# Altium footprint library QFN.PcbLib: 54 footprints (part 2 of 4)
Each footprint in its own frame and in the unit in brackets; x right, y up, seen from the top. Pads: shape width x height; smd on the part's side, far side on the other; paste and mask are expansions set on the pad; w line width, h text height; cw(c..) or ccw(c..) is an arc to the next point about the centre after c.
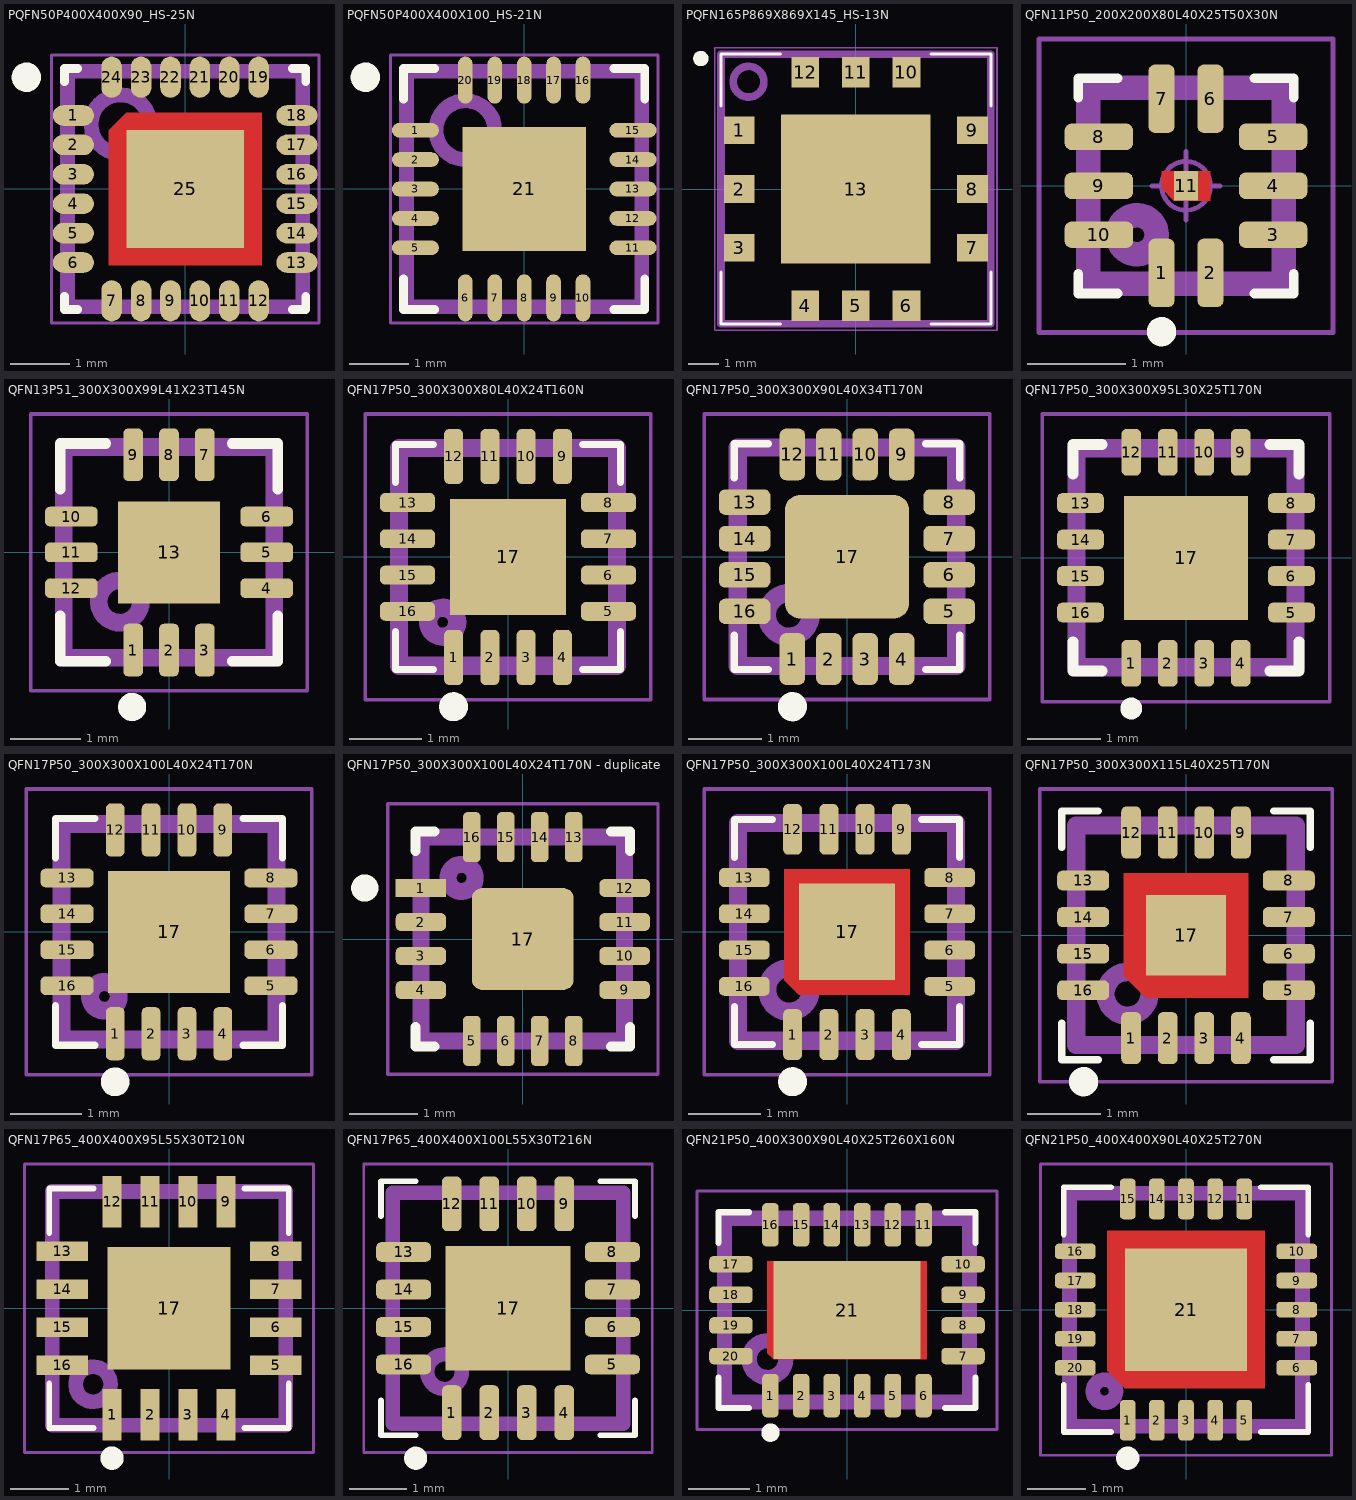
[diagram p1: the footprints below, top view; thin cyan lines are the x and y axes]

## PQFN50P400X400X90_HS-25N [mm] "PQFN, 24-Leads, Body 4,00x4,00mm, Pitch 0,50mm, Thermal Pad 2,60x2,60mm, IPC Medium Density"
height 0.9
pads (25):
  oval 0.7x0.35 smd: 1(-1.9,1.25) 2(-1.9,0.75) 3(-1.9,0.25) 4(-1.9,-0.25) 5(-1.9,-0.75) 6(-1.9,-1.25) 13(1.9,-1.25) 14(1.9,-0.75) 15(1.9,-0.25) 16(1.9,0.25) 17(1.9,0.75) 18(1.9,1.25)
  oval 0.35x0.7 smd: 7(-1.25,-1.9) 8(-0.75,-1.9) 9(-0.25,-1.9) 10(0.25,-1.9) 11(0.75,-1.9) 12(1.25,-1.9) 19(1.25,1.9) 20(0.75,1.9) 21(0.25,1.9) 22(-0.25,1.9) 23(-0.75,1.9) 24(-1.25,1.9)
  rect 2x2 smd: 25(0,0)
Top Layer:
  region: -1,1.3 1.3,1.3 1.3,-1.3 -1.3,-1.3 -1.3,1
Top Overlay:
  circle w0.25: c-2.7,1.9 r0.125
  lines w0.15: -2.05,-1.825 -2.05,-2.05 -1.825,-2.05 ; -2.05,1.825 -2.05,2.05 -1.825,2.05 ; 1.825,-2.05 2.05,-2.05 2.05,-1.825 ; 1.825,2.05 2.05,2.05 2.05,1.825
Top Assembly:
  circle w0.25: c-1.1,1.1 r0.5
  lines w0.25: -2,-2 2,-2 2,2 -2,2 -2,-2
  text ".Designator" at -1.6,-0.7 h1.5
Top Courtyard:
  circle w0.05: c0,0 r0.3
  lines w0.05: -0.5,0 0.5,0 ; 0,-0.5 0,0.5 ; -2.275,-2.275 2.275,-2.275 2.275,2.275 -2.275,2.275 -2.275,-2.275
3D body "PQFN50P400X400X90_HS-25N.step": height 0.9, standoff 0, extent -2,-2 2,2

## PQFN50P400X400X100_HS-21N [mm] "PQFN, 20-Leads, Body 4,00x4,00mm, Pitch 0,50mm, Thermal Pad 2,10x2,10mm, IPC Medium Density"
height 1
pads (21):
  oval 0.8x0.25 smd: 1(-1.85,1) 2(-1.85,0.5) 3(-1.85,0) 4(-1.85,-0.5) 5(-1.85,-1) 11(1.85,-1) 12(1.85,-0.5) 13(1.85,0) 14(1.85,0.5) 15(1.85,1)
  oval 0.25x0.8 smd: 6(-1,-1.85) 7(-0.5,-1.85) 8(0,-1.85) 9(0.5,-1.85) 10(1,-1.85) 16(1,1.85) 17(0.5,1.85) 18(0,1.85) 19(-0.5,1.85) 20(-1,1.85)
  rect 2.1x2.1 smd: 21(0,0)
Top Overlay:
  circle w0.25: c-2.7,1.9 r0.125
  lines w0.15: -2.05,-1.525 -2.05,-2.05 -1.525,-2.05 ; -2.05,1.525 -2.05,2.05 -1.525,2.05 ; 1.525,-2.05 2.05,-2.05 2.05,-1.525 ; 1.525,2.05 2.05,2.05 2.05,1.525
Top Assembly:
  circle w0.25: c-1,1 r0.5
  lines w0.25: -2,-2 -2,2 2,2 2,-2 -2,-2
  text ".Designator" at -1.6,-1 h1.5
Top Courtyard:
  circle w0.05: c0,0 r0.3
  lines w0.05: -0.5,0 0.5,0 ; 0,-0.5 0,0.5 ; -2.275,-2.275 -2.275,2.275 2.275,2.275 2.275,-2.275 -2.275,-2.275
3D body "PQFN50P400X400X100_HS-21N.step": height 1, standoff 0, extent -2,-2 2,2

## PQFN165P869X869X145_HS-13N [mm] "PQFN, 12-Leads, Body 8.69x8.69mm, Pitch 1.65mm/1.91mm, Thermal Pad 4.87x4.87mm, IPC Medium Density"
height 1.45
pads (13):
  rect 1x0.9 smd: 1(-3.8,1.91) 2(-3.8,0) 3(-3.8,-1.91) 7(3.8,-1.91) 8(3.8,0) 9(3.8,1.91)
  rect 0.9x1 smd: 4(-1.65,-3.8) 5(0,-3.8) 6(1.65,-3.8) 10(1.65,3.8) 11(0,3.8) 12(-1.65,3.8)
  rect 4.87x4.87 smd: 13(0,0)
Top Overlay:
  circle w0.25: c-5.05,4.25 r0.125
  lines w0.1: -4.4,-2.71 -4.4,-4.4 -2.45,-4.4 ; -4.4,2.71 -4.4,4.4 -2.45,4.4 ; 2.45,-4.4 4.4,-4.4 4.4,-2.71 ; 2.45,4.4 4.4,4.4 4.4,2.71
Top Assembly:
  circle w0.25: c-3.495,3.495 r0.5
  lines w0.25: -4.395,-4.395 4.395,-4.395 4.395,4.395 -4.395,4.395 -4.395,-4.395
  text ".Designator" at -3.5,-0.3 h1.5
Top Courtyard:
  lines w0.05: -4.6,-4.6 4.6,-4.6 4.6,4.6 -4.6,4.6 -4.6,-4.6
  lines w0.1: -0.5,0 0.5,0 ; 0,-0.5 0,0.5
3D body "PQFN165P869X869X145_HS-13N.step": height 1.45, standoff 0, extent -4.395,-4.395 4.395,4.395

## QFN11P50_200X200X80L40X25T50X30N [mm] "Quad Flat No-Lead (QFN with Tab), 0.50 mm pitch; square, 2 pin X 3 pin, 2.00 mm L X 2.00 mm W X 0.80 mm H body"
height 0.8
pads (11):
  rrect52% 0.27x0.7 smd: 1(-0.25,-0.89) 2(0.25,-0.89) 6(0.25,0.89) 7(-0.25,0.89)
  rrect52% 0.7x0.27 smd: 3(0.89,-0.5) 4(0.89,0) 5(0.89,0.5) 8(-0.89,0.5) 9(-0.89,0) 10(-0.89,-0.5)
  rect 0.25x0.3 smd paste-0.3 mask-0.3: 11(0,0)
Top Layer:
  region: 0.25,-0.15 -0.125,-0.15 -0.25,-0.025 -0.25,0.15 0.25,0.15
Top Overlay:
  circle w0.15: c-0.25,-1.49 r0.075
  lines w0.1: -1.1,-0.9 -1.1,-1.1 -0.7,-1.1 ; -1.1,0.9 -1.1,1.1 -0.7,1.1 ; 0.7,-1.1 1.1,-1.1 1.1,-0.9 ; 0.7,1.1 1.1,1.1 1.1,0.9
Top Paste:
  region: 0.25,-0.15 -0.125,-0.15 -0.25,-0.025 -0.25,0.15 0.25,0.15
Top Solder:
  region: 0.25,-0.15 -0.125,-0.15 -0.25,-0.025 -0.25,0.15 0.25,0.15
Top Assembly:
  circle w0.25: c-0.5,-0.5 r0.2
  lines w0.25: -1,-1 -1,1 1,1 1,-1 -1,-1
  text ".Designator" at -1.9,1.5 h1.5
Top Courtyard:
  circle w0.05: c0,0 r0.25
  lines w0.05: -0.35,0 0.35,0 ; 0,-0.35 0,0.35 ; -1.5,-1.5 -1.5,1.5 1.5,1.5 1.5,-1.5 -1.5,-1.5
3D body "QFN11P50_200X200X80L40X25T50X30.STEP": height 0.8, standoff 0, extent -1.05,-1.05 1.05,1.05

## QFN13P51_300X300X99L41X23T145N [mm] "Quad Flat No-Lead (QFN with Tab), 0.51 mm pitch; square, 3 pin X 3 pin, 3.00 mm L X 3.00 mm W X 0.99 mm H body"
height 0.99
pads (13):
  rrect50% 0.28x0.75 smd: 1(-0.51,-1.39) 2(0,-1.39) 3(0.51,-1.39) 7(0.51,1.39) 8(0,1.39) 9(-0.51,1.39)
  rrect50% 0.75x0.28 smd: 4(1.39,-0.51) 5(1.39,0) 6(1.39,0.51) 10(-1.39,0.51) 11(-1.39,0) 12(-1.39,-0.51)
  rect 1.45x1.45 smd paste-1.45: 13(0,0)
Top Overlay:
  circle w0.2: c-0.525,-2.2 r0.1
  lines w0.15: -1.55,-0.9 -1.55,-1.55 -0.9,-1.55 ; -1.55,0.9 -1.55,1.55 -0.9,1.55 ; 0.9,-1.55 1.55,-1.55 1.55,-0.9 ; 0.9,1.55 1.55,1.55 1.55,0.9
Top Paste:
  region: -0.105,0.105 -0.615,0.105 -0.615,0.615 -0.105,0.615
  region: -0.105,-0.615 -0.615,-0.615 -0.615,-0.105 -0.105,-0.105
  region: 0.615,0.105 0.105,0.105 0.105,0.615 0.615,0.615
  region: 0.615,-0.615 0.105,-0.615 0.105,-0.105 0.615,-0.105
Top Assembly:
  circle w0.25: c-0.7,-0.7 r0.3
  lines w0.25: -1.5,-1.5 1.5,-1.5 1.5,1.5 -1.5,1.5 -1.5,-1.5
  text ".Designator" at -1,0 h1.5
Top Courtyard:
  circle w0.05: c0,0 r0.25
  lines w0.05: -0.35,0 0.35,0 ; 0,-0.35 0,0.35 ; -1.97,-1.97 1.97,-1.97 1.97,1.97 -1.97,1.97 -1.97,-1.97
3D body "QFN13P51_300X300X99L41X23T145.STEP": height 0.99, standoff 0, extent -1.55,-1.55 1.55,1.55

## QFN17P50_300X300X80L40X24T160N [mm] "Quad Flat No-Lead (QFN with Tab), 0.50 mm pitch; square, 4 pin X 4 pin, 3.00 mm L X 3.00 mm W X 0.80 mm H body"
height 0.8
pads (17):
  rrect54% 0.26x0.76 smd: 1(-0.75,-1.385) 2(-0.25,-1.385) 3(0.25,-1.385) 4(0.75,-1.385) 9(0.75,1.385) 10(0.25,1.385) 11(-0.25,1.385) 12(-0.75,1.385)
  rrect54% 0.76x0.26 smd: 5(1.385,-0.75) 6(1.385,-0.25) 7(1.385,0.25) 8(1.385,0.75) 13(-1.385,0.75) 14(-1.385,0.25) 15(-1.385,-0.25) 16(-1.385,-0.75)
  rect 1.6x1.6 smd paste-1.6: 17(0,0)
Top Overlay:
  circle w0.2: c-0.75,-2.065 r0.1
  lines w0.1: -1.55,-1.03 -1.55,-1.55 -1.03,-1.55 ; -1.55,1.03 -1.55,1.55 -1.03,1.55 ; 1.03,-1.55 1.55,-1.55 1.55,-1.03 ; 1.03,1.55 1.55,1.55 1.55,1.03
Top Paste:
  region: 0.65,-0.65 0.08,-0.65 0.08,-0.08 0.65,-0.08
  region: 0.65,0.08 0.08,0.08 0.08,0.65 0.65,0.65
  region: -0.08,-0.65 -0.65,-0.65 -0.65,-0.08 -0.08,-0.08
  region: -0.08,0.08 -0.65,0.08 -0.65,0.65 -0.08,0.65
Top Assembly:
  circle w0.25: c-0.9,-0.9 r0.2
  lines w0.25: -1.5,-1.5 -1.5,1.5 1.5,1.5 1.5,-1.5 -1.5,-1.5
  text ".Designator" at -2.5,2 h1.5
Top Courtyard:
  circle w0.05: c0,0 r0.25
  lines w0.05: -0.35,0 0.35,0 ; 0,-0.35 0,0.35 ; -1.97,-1.97 -1.97,1.97 1.97,1.97 1.97,-1.97 -1.97,-1.97
3D body "QFN17P50_300X300X80L40X24T160.STEP": height 0.8, standoff 0, extent -1.55,-1.55 1.55,1.55

## QFN17P50_300X300X90L40X34T170N [mm] "Quad Flat No-Lead (QFN with Tab), 0.50 mm pitch; square, 4 pin X 4 pin, 3.00 mm L X 3.00 mm W X 0.90 mm H body"
height 0.9
pads (17):
  rrect51% 0.35x0.71 smd: 1(-0.75,-1.405) 2(-0.25,-1.405) 3(0.25,-1.405) 4(0.75,-1.405) 9(0.75,1.405) 10(0.25,1.405) 11(-0.25,1.405) 12(-0.75,1.405)
  rrect51% 0.71x0.35 smd: 5(1.405,-0.75) 6(1.405,-0.25) 7(1.405,0.25) 8(1.405,0.75) 13(-1.405,0.75) 14(-1.405,0.25) 15(-1.405,-0.25) 16(-1.405,-0.75)
  rrect24% 1.7x1.7 smd paste-1.7: 17(0,0)
Top Overlay:
  circle w0.2: c-0.75,-2.06 r0.1
  lines w0.1: -1.55,-1.08 -1.55,-1.55 -1.08,-1.55 ; -1.55,1.08 -1.55,1.55 -1.08,1.55 ; 1.08,-1.55 1.55,-1.55 1.55,-1.08 ; 1.08,1.55 1.55,1.55 1.55,1.08
Top Paste:
  region: 0.685,-0.685 0.085,-0.685 0.085,-0.085 0.685,-0.085
  region: 0.685,0.085 0.085,0.085 0.085,0.685 0.685,0.685
  region: -0.085,-0.685 -0.685,-0.685 -0.685,-0.085 -0.085,-0.085
  region: -0.085,0.085 -0.685,0.085 -0.685,0.685 -0.085,0.685
Top Assembly:
  circle w0.25: c-0.8,-0.8 r0.3
  lines w0.25: -1.5,-1.5 -1.5,1.5 1.5,1.5 1.5,-1.5 -1.5,-1.5
  text ".Designator" at -1.9,2 h1.5
Top Courtyard:
  circle w0.05: c0,0 r0.25
  lines w0.05: -0.35,0 0.35,0 ; 0,-0.35 0,0.35 ; -1.96,-1.96 -1.96,1.96 1.96,1.96 1.96,-1.96 -1.96,-1.96
3D body "QFN17P50_300X300X90L40X34T170.STEP": height 0.9, standoff 0, extent -1.55,-1.55 1.55,1.55

## QFN17P50_300X300X95L30X25T170N [mm] "Quad Flat No-Lead (QFN with Tab), 0.50 mm pitch; square, 4 pin X 4 pin, 3.00 mm L X 3.00 mm W X 0.95 mm H body"
height 0.95
pads (17):
  rrect52% 0.27x0.64 smd: 1(-0.75,-1.445) 2(-0.25,-1.445) 3(0.25,-1.445) 4(0.75,-1.445) 9(0.75,1.445) 10(0.25,1.445) 11(-0.25,1.445) 12(-0.75,1.445)
  rrect52% 0.64x0.27 smd: 5(1.445,-0.75) 6(1.445,-0.25) 7(1.445,0.25) 8(1.445,0.75) 13(-1.445,0.75) 14(-1.445,0.25) 15(-1.445,-0.25) 16(-1.445,-0.75)
  rect 1.7x1.7 smd paste-1.7: 17(0,0)
Top Overlay:
  circle w0.15: c-0.75,-2.065 r0.075
  lines w0.15: -1.55,-1.15 -1.55,-1.55 -1.15,-1.55 ; -1.55,1.15 -1.55,1.55 -1.15,1.55 ; 1.15,-1.55 1.55,-1.55 1.55,-1.15 ; 1.15,1.55 1.55,1.55 1.55,1.15
Top Paste:
  region: -0.125,0.125 -0.725,0.125 -0.725,0.725 -0.125,0.725
  region: -0.125,-0.725 -0.725,-0.725 -0.725,-0.125 -0.125,-0.125
  region: 0.725,0.125 0.125,0.125 0.125,0.725 0.725,0.725
  region: 0.725,-0.725 0.125,-0.725 0.125,-0.125 0.725,-0.125
Top Assembly:
  lines w0.25: -1.5,-1.5 1.5,-1.5 1.5,1.5 -1.5,1.5 -1.5,-1.5
  text ".Designator" at 0,0 h1.5
Top Courtyard:
  circle w0.05: c0,0 r0.25
  lines w0.05: -0.35,0 0.35,0 ; 0,-0.35 0,0.35 ; -1.97,-1.97 1.97,-1.97 1.97,1.97 -1.97,1.97 -1.97,-1.97
3D body "QFN17P50_300X300X95L30X25T170.STEP": height 0.95, standoff 0, extent -1.55,-1.55 1.55,1.55

## QFN17P50_300X300X100L40X24T170N [mm] "Quad Flat No-Lead (QFN with Tab), 0.50 mm pitch; square, 4 pin X 4 pin, 3.00 mm L X 3.00 mm W X 1.00 mm H body"
height 1
pads (17):
  rrect54% 0.26x0.74 smd: 1(-0.75,-1.42) 2(-0.25,-1.42) 3(0.25,-1.42) 4(0.75,-1.42) 9(0.75,1.42) 10(0.25,1.42) 11(-0.25,1.42) 12(-0.75,1.42)
  rrect54% 0.74x0.26 smd: 5(1.42,-0.75) 6(1.42,-0.25) 7(1.42,0.25) 8(1.42,0.75) 13(-1.42,0.75) 14(-1.42,0.25) 15(-1.42,-0.25) 16(-1.42,-0.75)
  rect 1.7x1.7 smd paste-1.7: 17(0,0)
Top Overlay:
  circle w0.2: c-0.75,-2.09 r0.1
  lines w0.1: -1.58,-1.03 -1.58,-1.58 -1.03,-1.58 ; -1.58,1.03 -1.58,1.58 -1.03,1.58 ; 1.03,-1.58 1.58,-1.58 1.58,-1.03 ; 1.03,1.58 1.58,1.58 1.58,1.03
Top Paste:
  region: -0.085,0.085 -0.685,0.085 -0.685,0.685 -0.085,0.685
  region: -0.085,-0.685 -0.685,-0.685 -0.685,-0.085 -0.085,-0.085
  region: 0.685,0.085 0.085,0.085 0.085,0.685 0.685,0.685
  region: 0.685,-0.685 0.085,-0.685 0.085,-0.085 0.685,-0.085
Top Assembly:
  circle w0.25: c-0.9,-0.9 r0.2
  lines w0.25: -1.5,-1.5 1.5,-1.5 1.5,1.5 -1.5,1.5 -1.5,-1.5
  text ".Designator" at -2,2 h1.5
Top Courtyard:
  circle w0.05: c0,0 r0.25
  lines w0.05: -0.35,0 0.35,0 ; 0,-0.35 0,0.35 ; -1.99,-1.99 1.99,-1.99 1.99,1.99 -1.99,1.99 -1.99,-1.99
3D body "QFN17P50_300X300X100L40X24T170.STEP": height 1, standoff 0, extent -1.55,-1.55 1.55,1.55

## QFN17P50_300X300X100L40X24T170N - duplicate [mm] "Quad Flat No-Lead (QFN with Tab), 0.50 mm pitch; square, 4 pin X 4 pin, 3.00 mm L X 3.00 mm W X 1.00 mm H body"
height 1
pads (17):
  rect 0.74x0.26 smd: 1(-1.5,0.75)
  rrect54% 0.74x0.26 smd: 2(-1.5,0.25) 3(-1.5,-0.25) 4(-1.5,-0.75) 9(1.5,-0.75) 10(1.5,-0.25) 11(1.5,0.25) 12(1.5,0.75)
  rrect54% 0.26x0.74 smd: 5(-0.75,-1.5) 6(-0.25,-1.5) 7(0.25,-1.5) 8(0.75,-1.5) 13(0.75,1.5) 14(0.25,1.5) 15(-0.25,1.5) 16(-0.75,1.5)
  rrect20% 1.5x1.5 smd paste-1.7: 17(0,0)
Top Overlay:
  circle w0.2: c-2.325,0.75 r0.1
  lines w0.15: -1.58,-1.3 -1.58,-1.58 -1.3,-1.58 ; -1.58,1.3 -1.58,1.58 -1.3,1.58 ; 1.3,-1.58 1.58,-1.58 1.58,-1.3 ; 1.3,1.58 1.58,1.58 1.58,1.3
Top Paste:
  region: 0.085,0.085 0.085,0.685 0.685,0.685 0.685,0.085
  region: -0.685,0.085 -0.685,0.685 -0.085,0.685 -0.085,0.085
  region: 0.085,-0.685 0.085,-0.085 0.685,-0.085 0.685,-0.685
  region: -0.685,-0.685 -0.685,-0.085 -0.085,-0.085 -0.085,-0.685
Top Assembly:
  circle w0.25: c-0.9,0.9 r0.2
  lines w0.25: -1.5,-1.5 -1.5,1.5 1.5,1.5 1.5,-1.5 -1.5,-1.5
  text ".Designator" at -0.7,-0.05 h1.5
Top Courtyard:
  circle w0.05: c0,0 r0.25
  lines w0.05: -0.35,0 0.35,0 ; 0,-0.35 0,0.35 ; -1.99,-1.99 -1.99,1.99 1.99,1.99 1.99,-1.99 -1.99,-1.99
3D body "QFN17P50_300X300X100L40X24T170.STEP": height 1, standoff 0, extent -1.55,-1.55 1.55,1.55

## QFN17P50_300X300X100L40X24T173N [mm] "Quad Flat No-Lead (QFN with Tab), 0.50 mm pitch; square, 4 pin X 4 pin, 3.00 mm L X 3.00 mm W X 1.00 mm H body"
height 1
pads (17):
  rrect54% 0.26x0.7 smd: 1(-0.75,-1.415) 2(-0.25,-1.415) 3(0.25,-1.415) 4(0.75,-1.415) 9(0.75,1.415) 10(0.25,1.415) 11(-0.25,1.415) 12(-0.75,1.415)
  rrect54% 0.7x0.26 smd: 5(1.415,-0.75) 6(1.415,-0.25) 7(1.415,0.25) 8(1.415,0.75) 13(-1.415,0.75) 14(-1.415,0.25) 15(-1.415,-0.25) 16(-1.415,-0.75)
  rect 1.33x1.33 smd paste-1.33 mask-1.33: 17(0,0)
Top Layer:
  region: 0.865,-0.865 -0.665,-0.865 -0.865,-0.665 -0.865,0.865 0.865,0.865
Top Overlay:
  circle w0.2: c-0.75,-2.065 r0.1
  lines w0.1: -1.55,-1.03 -1.55,-1.55 -1.03,-1.55 ; -1.55,1.03 -1.55,1.55 -1.03,1.55 ; 1.03,-1.55 1.55,-1.55 1.55,-1.03 ; 1.03,1.55 1.55,1.55 1.55,1.03
Top Assembly:
  circle w0.25: c-0.8,-0.8 r0.3
  lines w0.25: -1.5,-1.5 -1.5,1.5 1.5,1.5 1.5,-1.5 -1.5,-1.5
  text ".Designator" at -2.4,2.1 h1.5
Top Courtyard:
  circle w0.05: c0,0 r0.25
  lines w0.05: -0.35,0 0.35,0 ; 0,-0.35 0,0.35 ; -1.97,-1.97 -1.97,1.97 1.97,1.97 1.97,-1.97 -1.97,-1.97
3D body "QFN17P50_300X300X100L40X24T173.STEP": height 1, standoff 0, extent -1.55,-1.55 1.55,1.55

## QFN17P50_300X300X115L40X25T170N [mm] "Quad Flat No-Lead (QFN with Tab), 0.50 mm pitch; square, 4 pin X 4 pin, 3.00 mm L X 3.00 mm W X 1.15 mm H body"
height 1.15
pads (17):
  rrect52% 0.27x0.71 smd: 1(-0.75,-1.405) 2(-0.25,-1.405) 3(0.25,-1.405) 4(0.75,-1.405) 9(0.75,1.405) 10(0.25,1.405) 11(-0.25,1.405) 12(-0.75,1.405)
  rrect52% 0.71x0.27 smd: 5(1.405,-0.75) 6(1.405,-0.25) 7(1.405,0.25) 8(1.405,0.75) 13(-1.405,0.75) 14(-1.405,0.25) 15(-1.405,-0.25) 16(-1.405,-0.75)
  rect 1.1x1.1 smd paste-1.1 mask-1.1: 17(0,0)
Top Layer:
  region: 0.85,-0.85 -0.55,-0.85 -0.85,-0.55 -0.85,0.85 0.85,0.85
Top Overlay:
  circle w0.2: c-1.4,-2 r0.1
  lines w0.1: -1.7,-1.2 -1.7,-1.7 -1.2,-1.7 ; -1.7,1.2 -1.7,1.7 -1.2,1.7 ; 1.2,-1.7 1.7,-1.7 1.7,-1.2 ; 1.2,1.7 1.7,1.7 1.7,1.2
Top Paste:
  region: -0.085,0.085 -0.685,0.085 -0.685,0.685 -0.085,0.685
  region: -0.085,-0.685 -0.685,-0.685 -0.685,-0.085 -0.085,-0.085
  region: 0.685,0.085 0.085,0.085 0.085,0.685 0.685,0.685
  region: 0.685,-0.685 0.085,-0.685 0.085,-0.085 0.685,-0.085
Top Solder:
  region: 0.85,-0.85 -0.55,-0.85 -0.85,-0.55 -0.85,0.85 0.85,0.85
Top Assembly:
  circle w0.25: c-0.8,-0.8 r0.3
  lines w0.25: -1.5,-1.5 1.5,-1.5 1.5,1.5 -1.5,1.5 -1.5,-1.5
  text ".Designator" at -2.934,2.41 h1.5
Top Courtyard:
  circle w0.05: c0,0 r0.25
  lines w0.05: -0.35,0 0.35,0 ; 0,-0.35 0,0.35 ; -2,-2 2,-2 2,2 -2,2 -2,-2
3D body "QFN17P50_300X300X115L40X25T170.STEP": height 1.15, standoff 0, extent -1.55,-1.55 1.55,1.55

## QFN17P65_400X400X95L55X30T210N [mm] "Quad Flat No-Lead (QFN with Tab), 0.65 mm pitch; square, 4 pin X 4 pin, 4.00 mm L X 4.00 mm W X 0.95 mm H body"
height 0.95
pads (17):
  rect 0.33x0.88 smd: 1(-0.975,-1.825) 2(-0.325,-1.825) 3(0.325,-1.825) 4(0.975,-1.825) 9(0.975,1.825) 10(0.325,1.825) 11(-0.325,1.825) 12(-0.975,1.825)
  rect 0.88x0.33 smd: 5(1.825,-0.975) 6(1.825,-0.325) 7(1.825,0.325) 8(1.825,0.975) 13(-1.825,0.975) 14(-1.825,0.325) 15(-1.825,-0.325) 16(-1.825,-0.975)
  rect 2.1x2.1 smd paste-2.1: 17(0,0)
Top Overlay:
  circle w0.2: c-0.975,-2.565 r0.1
  lines w0.1: -2.05,-1.29 -2.05,-2.05 -1.29,-2.05 ; -2.05,1.29 -2.05,2.05 -1.29,2.05 ; 1.29,-2.05 2.05,-2.05 2.05,-1.29 ; 1.29,2.05 2.05,2.05 2.05,1.29
Top Paste:
  region: -0.105,0.105 -0.845,0.105 -0.845,0.845 -0.105,0.845
  region: -0.105,-0.845 -0.845,-0.845 -0.845,-0.105 -0.105,-0.105
  region: 0.845,0.105 0.105,0.105 0.105,0.845 0.845,0.845
  region: 0.845,-0.845 0.105,-0.845 0.105,-0.105 0.845,-0.105
Top Assembly:
  circle w0.25: c-1.3,-1.3 r0.3
  lines w0.25: -2,-2 2,-2 2,2 -2,2 -2,-2
  text ".Designator" at -1.7,-0.3 h1.5
Top Courtyard:
  circle w0.05: c0,0 r0.25
  lines w0.05: -0.35,0 0.35,0 ; 0,-0.35 0,0.35 ; -2.47,-2.47 2.47,-2.47 2.47,2.47 -2.47,2.47 -2.47,-2.47
3D body "QFN17P65_400X400X95L55X30T210.STEP": height 0.95, standoff 0, extent -2.05,-2.05 2.05,2.05

## QFN17P65_400X400X100L55X30T216N [mm] "Quad Flat No-Lead (QFN with Tab), 0.65 mm pitch; square, 4 pin X 4 pin, 4.00 mm L X 4.00 mm W X 1.00 mm H body"
height 1
pads (17):
  rrect53% 0.34x0.95 smd: 1(-0.975,-1.81) 2(-0.325,-1.81) 3(0.325,-1.81) 4(0.975,-1.81) 9(0.975,1.81) 10(0.325,1.81) 11(-0.325,1.81) 12(-0.975,1.81)
  rrect53% 0.95x0.34 smd: 5(1.81,-0.975) 6(1.81,-0.325) 7(1.81,0.325) 8(1.81,0.975) 13(-1.81,0.975) 14(-1.81,0.325) 15(-1.81,-0.325) 16(-1.81,-0.975)
  rect 2.16x2.16 smd paste-2.16: 17(0,0)
Top Overlay:
  circle w0.2: c-1.6,-2.6 r0.1
  lines w0.1: -2.2,-1.6 -2.2,-2.2 -1.6,-2.2 ; -2.2,1.6 -2.2,2.2 -1.6,2.2 ; 1.6,-2.2 2.2,-2.2 2.2,-1.6 ; 1.6,2.2 2.2,2.2 2.2,1.6
Top Paste:
  region: -0.105,0.105 -0.865,0.105 -0.865,0.865 -0.105,0.865
  region: -0.105,-0.865 -0.865,-0.865 -0.865,-0.105 -0.105,-0.105
  region: 0.865,0.105 0.105,0.105 0.105,0.865 0.865,0.865
  region: 0.865,-0.865 0.105,-0.865 0.105,-0.105 0.865,-0.105
Top Assembly:
  circle w0.25: c-1.1,-1.1 r0.3
  lines w0.25: -2,-2 2,-2 2,2 -2,2 -2,-2
  text ".Designator" at -1.8,-0.3 h1.5
Top Courtyard:
  circle w0.05: c0,0 r0.25
  lines w0.05: -0.35,0 0.35,0 ; 0,-0.35 0,0.35 ; -2.5,-2.5 2.5,-2.5 2.5,2.5 -2.5,2.5 -2.5,-2.5
3D body "QFN17P65_400X400X100L55X30T216.STEP": height 1, standoff 0, extent -2.05,-2.05 2.05,2.05

## QFN21P50_400X300X90L40X25T260X160N [mm] "Quad Flat No-Lead (QFN with Tab), 0.50 mm pitch; rect., 6 pin X 4 pin, 4.00 mm L X 3.00 mm W X 0.90 mm H body"
height 0.9
pads (21):
  rrect52% 0.27x0.71 smd: 1(-1.25,-1.395) 2(-0.75,-1.395) 3(-0.25,-1.395) 4(0.25,-1.395) 5(0.75,-1.395) 6(1.25,-1.395) 11(1.25,1.395) 12(0.75,1.395) 13(0.25,1.395) 14(-0.25,1.395) 15(-0.75,1.395) 16(-1.25,1.395)
  rrect52% 0.71x0.27 smd: 7(1.895,-0.75) 8(1.895,-0.25) 9(1.895,0.25) 10(1.895,0.75) 17(-1.895,0.75) 18(-1.895,0.25) 19(-1.895,-0.25) 20(-1.895,-0.75)
  rect 2.4x1.6 smd paste-2.4 mask-2.4: 21(0,0)
Top Layer:
  region: 1.3,-0.8 -1.2,-0.8 -1.3,-0.7 -1.3,0.8 1.3,0.8
Top Overlay:
  circle w0.15: c-1.25,-2 r0.075
  lines w0.1: -2.1,-1.1 -2.1,-1.6 -1.6,-1.6 ; -2.1,1.1 -2.1,1.6 -1.6,1.6 ; 1.6,-1.6 2.1,-1.6 2.1,-1.1 ; 1.6,1.6 2.1,1.6 2.1,1.1
Top Paste:
  region: -0.145,0.145 -1.155,0.145 -1.155,0.655 -0.145,0.655
  region: -0.145,-0.655 -1.155,-0.655 -1.155,-0.145 -0.145,-0.145
  region: 1.155,0.145 0.145,0.145 0.145,0.655 1.155,0.655
  region: 1.155,-0.655 0.145,-0.655 0.145,-0.145 1.155,-0.145
Top Solder:
  region: 1.3,-0.8 -1.2,-0.8 -1.3,-0.7 -1.3,0.8 1.3,0.8
Top Assembly:
  circle w0.25: c-1.3,-0.8 r0.3
  lines w0.25: -2,-1.5 2,-1.5 2,1.5 -2,1.5 -2,-1.5
  text ".Designator" at -1.7,0 h1.5
Top Courtyard:
  circle w0.05: c0,0 r0.25
  lines w0.05: -0.35,0 0.35,0 ; 0,-0.35 0,0.35 ; -2.45,-1.95 2.45,-1.95 2.45,1.95 -2.45,1.95 -2.45,-1.95
3D body "QFN21P50_400X300X90L40X25T260X160.STEP": height 0.9, standoff 0, extent -2.05,-1.55 2.05,1.55

## QFN21P50_400X400X90L40X25T270N [mm] "Quad Flat No-Lead (QFN with Tab), 0.50 mm pitch; square, 5 pin X 5 pin, 4.00 mm L X 4.00 mm W X 0.90 mm H body"
height 0.9
pads (21):
  rrect52% 0.27x0.7 smd: 1(-1,-1.9) 2(-0.5,-1.9) 3(0,-1.9) 4(0.5,-1.9) 5(1,-1.9) 11(1,1.9) 12(0.5,1.9) 13(0,1.9) 14(-0.5,1.9) 15(-1,1.9)
  rrect52% 0.7x0.27 smd: 6(1.9,-1) 7(1.9,-0.5) 8(1.9,0) 9(1.9,0.5) 10(1.9,1) 16(-1.9,1) 17(-1.9,0.5) 18(-1.9,0) 19(-1.9,-0.5) 20(-1.9,-1)
  rect 2.1x2.1 smd paste-2.1 mask-2.1: 21(0,0)
Top Layer:
  region: 1.35,-1.35 -1.05,-1.35 -1.35,-1.05 -1.35,1.35 1.35,1.35
Top Overlay:
  circle w0.2: c-1,-2.55 r0.1
  lines w0.1: -2.1,-1.29 -2.1,-2.1 -1.29,-2.1 ; -2.1,1.29 -2.1,2.1 -1.29,2.1 ; 1.29,-2.1 2.1,-2.1 2.1,-1.29 ; 1.29,2.1 2.1,2.1 2.1,1.29
Top Paste:
  region: -0.13,0.13 -1.09,0.13 -1.09,1.09 -0.13,1.09
  region: -0.13,-1.09 -1.09,-1.09 -1.09,-0.13 -0.13,-0.13
  region: 1.09,0.13 0.13,0.13 0.13,1.09 1.09,1.09
  region: 1.09,-1.09 0.13,-1.09 0.13,-0.13 1.09,-0.13
Top Solder:
  region: 1.35,-1.35 -1.05,-1.35 -1.35,-1.05 -1.35,1.35 1.35,1.35
Top Assembly:
  circle w0.25: c-1.4,-1.4 r0.2
  lines w0.25: -2,-2 2,-2 2,2 -2,2 -2,-2
  text ".Designator" at -1.8,-0.4 h1.5
Top Courtyard:
  circle w0.05: c0,0 r0.25
  lines w0.05: -0.35,0 0.35,0 ; 0,-0.35 0,0.35 ; -2.5,-2.5 2.5,-2.5 2.5,2.5 -2.5,2.5 -2.5,-2.5
3D body "QFN21P50_400X400X90L40X25T270.STEP": height 0.9, standoff 0, extent -2.05,-2.05 2.05,2.05